# Altium footprint library Chronos.PcbLib: 65 footprints (part 2 of 5)
Each footprint in its own frame and in the unit in brackets; x right, y up, seen from the top. Pads: shape width x height; smd on the part's side, far side on the other; paste and mask are expansions set on the pad; w line width, h text height; cw(c..) or ccw(c..) is an arc to the next point about the centre after c.
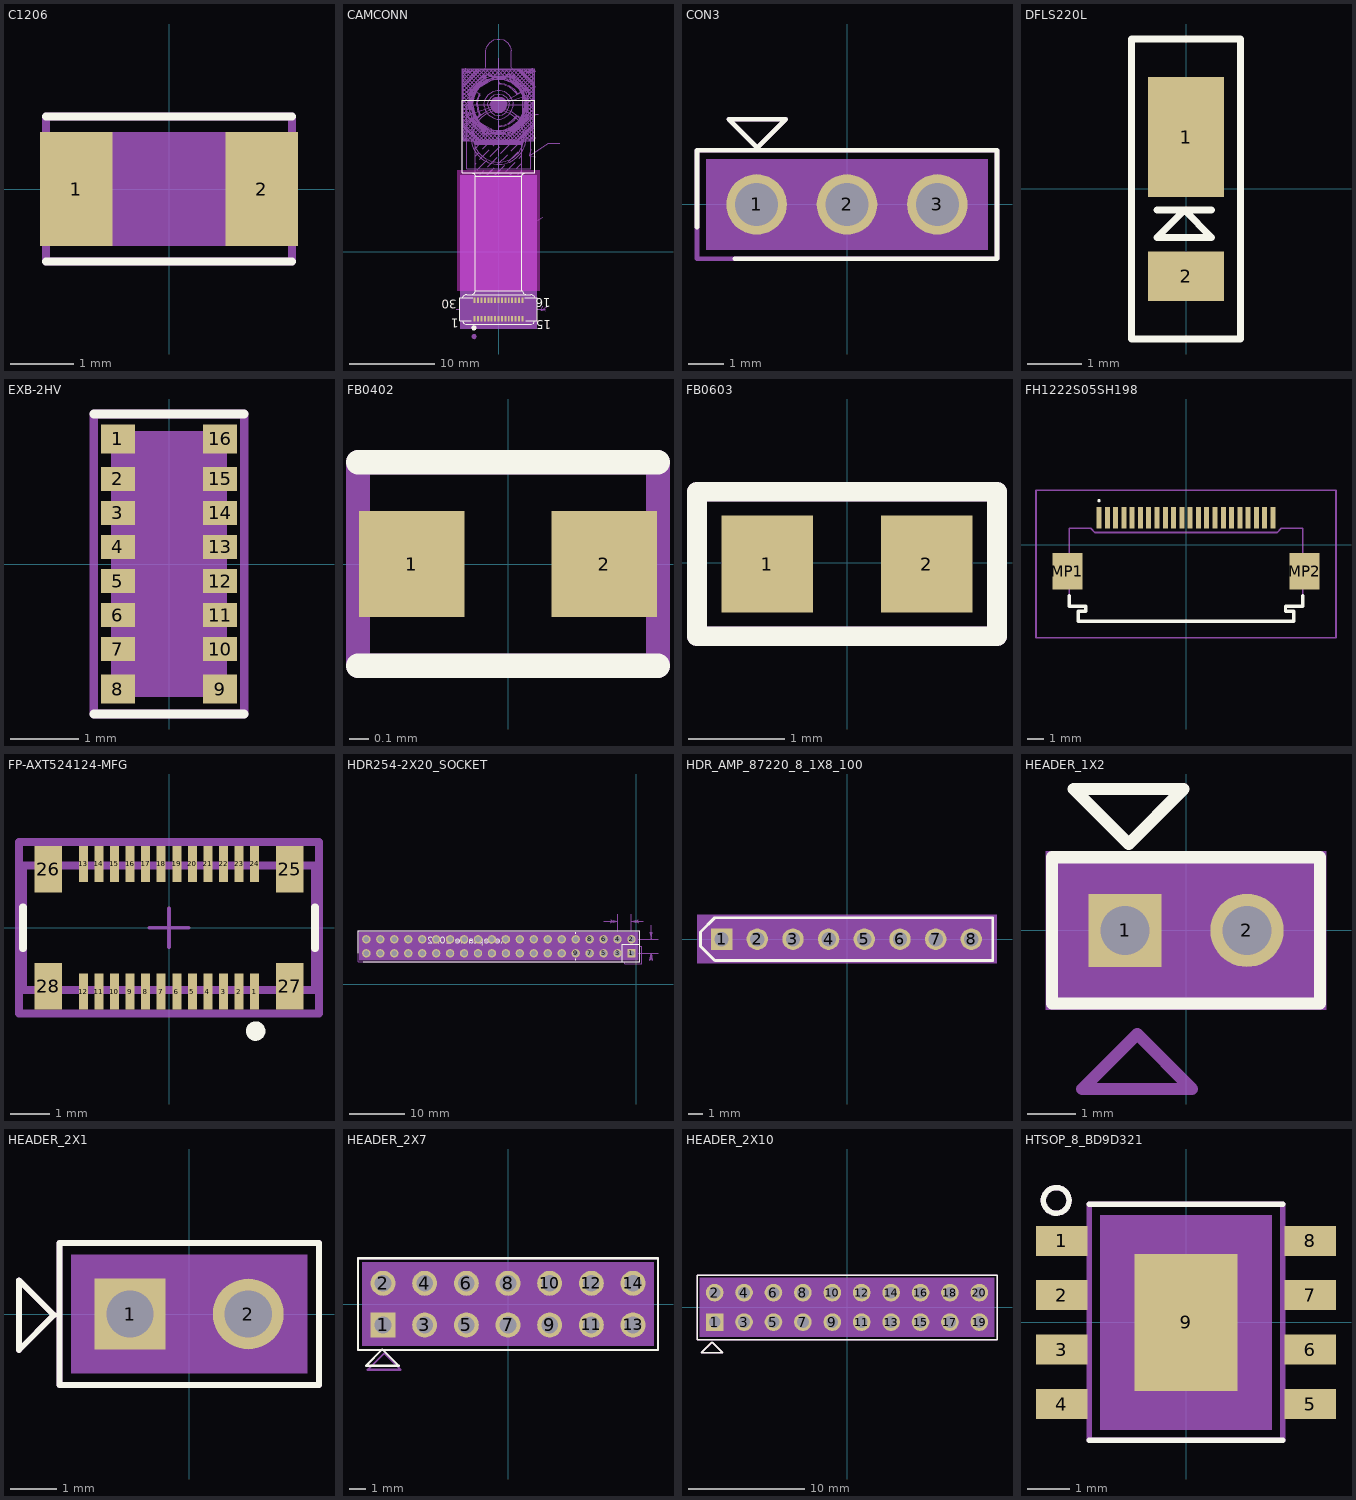
[diagram p1: the footprints below, top view; thin cyan lines are the x and y axes]

## C1206 [mm] "C1206"
pads (2):
  rect 1.16x1.82 smd: 1(-1.475,0) 2(1.475,0)
Top Overlay:
  lines w0.127: -1.954,-1.154 1.954,-1.154 ; -1.954,1.154 1.954,1.154
Top 3D Body:
  region: -1.7,-0.9 1.7,-0.9 1.7,0.9 -1.7,0.9
Top Assembly:
  lines w0.127: -1.954,-1.154 -1.954,1.154 1.954,1.154 1.954,-1.154 -1.954,-1.154
  text ".Designator" at 2.942,1.663 h1.02
Mechanical 29:
  text "2" at 1.475,0.203 h0.51
  text "1" at -1.475,0.203 h0.51
3D body: height 3.81, standoff 0, extent -1.7,-0.9 1.7,0.9

## CAMCONN [mm] "CAMCONN"
pads (30):
  rect 0.23x0.65 smd: 1(-2.8,-7.825) 2(-2.4,-7.825) 3(-2,-7.825) 4(-1.6,-7.825) 5(-1.2,-7.825) 6(-0.8,-7.825) 7(-0.4,-7.825) 8(0,-7.825) 9(0.4,-7.825) 10(0.8,-7.825) 11(1.2,-7.825) 12(1.6,-7.825) 13(2,-7.825) 14(2.4,-7.825) 15(2.8,-7.825) 16(2.8,-5.675) 17(2.4,-5.675) 18(2,-5.675) 19(1.6,-5.675) 20(1.2,-5.675) 21(0.8,-5.675) 22(0.4,-5.675) 23(0,-5.675) 24(-0.4,-5.675) 25(-0.8,-5.675) 26(-1.2,-5.675) 27(-1.6,-5.675) 28(-2,-5.675) 29(-2.4,-5.675) 30(-2.8,-5.675)
Top Layer keep-out:
  region: -4.826,9.582 -4.826,-4.566 4.826,-4.566 4.826,9.582
Top Overlay:
  dashed: -3.181,-8.914 -3.159,-9.025 -3.096,-9.119 -3.002,-9.181 -2.891,-9.204 -2.781,-9.181 -2.749,-9.16 -2.687,-9.119 -2.624,-9.025 -2.602,-8.914 -2.624,-8.803 -2.687,-8.709 -2.749,-8.668 -2.781,-8.646 -2.891,-8.624 -3.002,-8.646 -3.096,-8.709 -3.159,-8.803
  lines w0.127: -4.238,-8.085 -4.094,-8.347 -3.833,-8.491 -3.745,-8.491 ; -4.238,-5.394 -4.094,-5.132 -3.833,-4.988 -3.745,-4.988 ; -3.755,-8.491 3.755,-8.491 ; -3.755,-5.009 -3.147,-5.009 3.252,-5.009 3.755,-5.009 ; -3.175,-8.1 -4.55,-8.1 -4.55,-5.4 -3.048,-5.4 ; -3.147,9.283 -3,9.241 -2.874,9.157 -2.79,9.031 -2.749,8.884 ; -3.065,-4.988 -2.847,-4.868 -2.728,-4.651 -2.728,-4.579 ; 2.748,-4.505 2.748,1.378 2.748,8.884 ; 2.769,-4.589 -2.749,-4.589 -2.749,1.378 -2.749,8.884 ; 2.769,-4.582 2.914,-4.844 3.174,-4.988 ; 3.048,-5.4 4.55,-5.4 4.55,-8.1 3.175,-8.1 ; 3.147,9.283 3,9.241 2.874,9.157 2.79,9.031 2.748,8.884 ; 3.766,-8.491 3.852,-8.491 4.114,-8.347 4.259,-8.085 ; 3.766,-4.988 3.852,-4.988 4.114,-5.132 4.259,-5.394 ; -2.749,8.884 0,8.884 2.748,8.884 ; -4.259,9.283 4.259,9.283 4.259,17.779 -4.259,17.779 -4.259,9.283
  text "1" at -4.661,-7.833 h1.02
  text "15" at 6.176,-8.005 h1.02
  text "16" at 6.11,-5.445 h1.02
  text "30" at -4.886,-5.631 h1.02
Top 3D Body:
  region: 4.5,-6.75 4.5,9 -4.5,9 -4.5,-9 4.5,-9 4.5,-7.233
  region: -4.3,-7.85 -4.3,-5.65 4.3,-5.65 4.3,-7.85
Top Assembly:
  circle w0.127: c0,13.52 r3
  circle w0.127: c0,13.52 r3.25
  dashed: -3.159,-9.933 -3.137,-10.044 -3.075,-10.138 -2.981,-10.2 -2.87,-10.222 -2.759,-10.2 -2.727,-10.179 -2.665,-10.138 -2.602,-10.044 -2.58,-9.933 -2.602,-9.822 -2.665,-9.728 -2.727,-9.686 -2.759,-9.665 -2.87,-9.643 -2.981,-9.665 -3.075,-9.728 -3.137,-9.822
  lines w0.127: -4.259,-8.009 -4.259,-5.491 ; -4.238,-7.998 -4.238,-8.085 -4.094,-8.347 -3.833,-8.491 -3.745,-8.491 ; -4.238,-5.481 -4.238,-5.394 -4.094,-5.132 -3.833,-4.988 -3.745,-4.988 ; -3.755,-8.491 3.755,-8.491 ; -3.755,-5.009 -3.147,-5.009 3.252,-5.009 3.755,-5.009 ; -3.163,-5.65 -4.3,-5.65 -4.3,-7.85 -3.152,-7.85 ; -3.147,9.283 -3,9.241 -2.874,9.157 -2.79,9.031 -2.749,8.884 ; -3.065,-4.988 -2.847,-4.868 -2.728,-4.651 -2.728,-4.579 ; -2.749,-0.319 -2.749,8.884 ; -2.749,-0.24 -2.749,-4.589 2.769,-4.589 ; 1.268,14.698 1.101,13.949 ; 1.714,13.828 1.101,13.949 ; 2.748,-4.505 2.748,-0.319 2.748,8.884 ; 2.769,-4.582 2.914,-4.844 3.174,-4.988 ; 3.103,-5.65 4.3,-5.65 4.3,-7.85 3.126,-7.85 ; 3.111,3.291 2.903,2.776 ; 3.147,9.283 3,9.241 2.874,9.157 2.79,9.031 2.748,8.884 ; 3.432,2.655 2.903,2.776 ; 3.766,-8.491 3.852,-8.491 4.114,-8.347 4.259,-8.085 4.259,-7.998 ; 3.766,-4.988 3.852,-4.988 4.114,-5.132 4.259,-5.394 4.259,-5.481 ; 3.854,12.047 3.687,11.298 ; 4.259,-8.009 4.259,-5.491 ; 4.3,11.177 3.687,11.298 ; 4.668,16.167 4.416,16.167 4.416,16.166 1.101,13.949 ; 5.167,-6.362 5.027,-6.839 ; 5.211,4.04 2.903,2.776 ; 5.503,-6.933 5.027,-6.839 ; 5.78,-6.373 5.027,-6.839 ; 7.153,12.747 5.847,12.747 5.835,12.735 3.687,11.298 ; -2.749,8.884 0,8.884 2.748,8.884 ; -4.259,9.283 -4.259,17.779 4.259,17.779 4.259,9.283 -4.259,9.283 ; -3.75,9.77 -3.75,17.271 3.75,17.271 3.75,9.77 -3.75,9.77
  text "CONDUCTIVE ADHESIVE - CONTACT AREA" at 8.195,14.914 h0.18
  text "Cu EXPOSURE - GROUNDING" at 7.636,14.977 h0.18
  text "1" at -5.071,-7.988 h0.18
  text "30" at -5.421,-5.841 h0.18
  text "16" at 4.905,-5.752 h0.18
  text "15" at 4.957,-8.023 h0.18
  text ".Designator" at -2.492,-8.543 h0.18
  text "BENDING AREA" at 5.827,7.065 h0.18
  text "CAMERA" at 5.024,19.477 h0.18
  text "MATTING AREA" at 6.503,-7.982 h0.18
Mechanical 29:
  text "16" at 3.088,-5.675 h0.18
  text "17" at 2.688,-5.675 h0.18
  text "27" at -1.312,-5.675 h0.18
  text "28" at -1.712,-5.675 h0.18
  text "30" at -2.512,-5.675 h0.18
  text "13" at 2.288,-7.825 h0.18
  text "10" at 1.088,-7.825 h0.18
  text "7" at -0.256,-7.825 h0.18
  text "4" at -1.456,-7.825 h0.18
  text "21" at 1.088,-5.675 h0.18
  text "19" at 1.888,-5.675 h0.18
  text "1" at -2.656,-7.825 h0.18
  text "26" at -0.912,-5.675 h0.18
  text "22" at 0.688,-5.675 h0.18
  text "23" at 0.288,-5.675 h0.18
  text "18" at 2.288,-5.675 h0.18
  text "29" at -2.112,-5.675 h0.18
  text "15" at 3.088,-7.825 h0.18
  text "24" at -0.112,-5.675 h0.18
  text "25" at -0.512,-5.675 h0.18
  text "2" at -2.256,-7.825 h0.18
  text "12" at 1.888,-7.825 h0.18
  text "8" at 0.144,-7.825 h0.18
  text "14" at 2.688,-7.825 h0.18
  text "11" at 1.488,-7.825 h0.18
  text "5" at -1.056,-7.825 h0.18
  text "6" at -0.656,-7.825 h0.18
  text "9" at 0.544,-7.825 h0.18
  text "3" at -1.856,-7.825 h0.18
  text "20" at 1.488,-5.675 h0.18
Mechanical 31:
  drawing of 4435 lines, arcs and shapes, not listed
3D body: height 3.81, standoff 0, extent -4.5,-9 4.5,9
3D body: height 3.81, standoff 0, extent -4.3,-7.85 4.3,-5.65

## CON3 [mm] "CON3"
pads (3):
  round 1.7 hole 1.2: 1(-2.54,0) 2(0,0) 3(2.54,0)
Top Overlay:
  lines w0.127: -4.214,-0.636 -4.214,1.524 4.214,1.524 4.214,-1.524 -3.158,-1.524 ; -3.322,2.394 -2.522,1.594 -1.722,2.394 -3.322,2.394
  text ".Designator" at -0.455,1.917 h1.02
Top 3D Body:
  region: -3.96,1.27 -3.96,-1.27 3.96,-1.27 3.96,1.27
Top Assembly:
  lines w0.127: -4.214,-1.524 4.214,-1.524 4.214,1.524 -4.214,1.524 -4.214,-1.524 ; -3.322,2.394 -2.522,1.594 -1.722,2.394 -3.322,2.394
Mechanical 29:
  text "3" at 1.93,0 h1.52
  text "2" at -0.61,0 h1.52
  text "1" at -3.15,0 h1.52
3D body: height 3.81, standoff 0, extent -3.96,-1.27 3.96,1.27

## DFLS220L [mm] "DFLS220L"
pads (2):
  rect 1.4x2.2 smd: 1(0,0.95)
  rect 1.4x0.9 smd: 2(0,-1.6)
Top Overlay:
  lines w0.127: -0.53,-0.385 0.47,-0.385 ; -1.001,-2.751 1.001,-2.751 1.001,2.751 -1.001,2.751 -1.001,-2.751 ; -0.53,-0.886 0.47,-0.886 -0.03,-0.385 -0.53,-0.886
Mechanical 29:
  text "2" at 0,-2.108 h0.64
  text "1" at 0,0.442 h0.64
3D body "SOD-123_ONS.step": height 1.35, standoff 0, extent -0.915,-1.93 0.889,1.93

## EXB-2HV [mm] "EXB-2HV"
pads (16):
  rect 0.5x0.425 smd: 1(-0.75,1.837) 8(-0.75,-1.837) 9(0.75,-1.837) 16(0.75,1.837)
  rect 0.5x0.35 smd: 2(-0.75,1.25) 3(-0.75,0.75) 4(-0.75,0.25) 5(-0.75,-0.25) 6(-0.75,-0.75) 7(-0.75,-1.25) 10(0.75,-1.25) 11(0.75,-0.75) 12(0.75,-0.25) 13(0.75,0.25) 14(0.75,0.75) 15(0.75,1.25)
Top Overlay:
  lines w0.127: -1.104,-2.204 1.104,-2.204 ; -1.104,2.204 1.104,2.204
  text ".Designator" at 1.643,1.091 h1.02
Top 3D Body:
  region: -0.85,1.95 -0.85,-1.95 0.85,-1.95 0.85,1.95
Top Assembly:
  lines w0.127: -1.104,-2.204 -1.104,2.204 1.104,2.204 1.104,-2.204 -1.104,-2.204
Mechanical 29:
  text "8" at -1.36,-1.837 h1.52
  text "6" at -1.36,-0.75 h1.52
  text "4" at -1.36,0.25 h1.52
  text "5" at -1.36,-0.25 h1.52
  text "3" at -1.36,0.75 h1.52
  text "1" at -1.36,1.837 h1.52
  text "7" at -1.36,-1.25 h1.52
  text "2" at -1.36,1.25 h1.52
  text "16" at -0.469,1.837 h1.52
  text "9" at 0.14,-1.837 h1.52
  text "10" at -0.469,-1.25 h1.52
  text "11" at -0.469,-0.75 h1.52
  text "12" at -0.469,-0.25 h1.52
  text "13" at -0.469,0.25 h1.52
  text "14" at -0.469,0.75 h1.52
  text "15" at -0.469,1.25 h1.52
3D body: height 3.81, standoff 0, extent -0.85,-1.95 0.85,1.95

## FB0402 [mm] "FB0402"
pads (2):
  rect 0.55x0.55 smd: 1(-0.5,0) 2(0.5,0)
Top Overlay:
  lines w0.127: -0.779,-0.529 0.779,-0.529 ; -0.779,0.529 0.779,0.529
  text ".Designator" at -2.921,1.143 h1.02
Top Assembly:
  lines w0.127: -0.779,-0.529 0.779,-0.529 0.779,0.529 -0.779,0.529 -0.779,-0.529
Mechanical 29:
  text "1" at -0.5,0.203 h0.51
  text "2" at 0.5,0.203 h0.51
3D body "FER 0402.STEP": height 0.52, standoff 0, extent -0.5,-0.262 0.5,0.262

## FB0603 [mm] "FB0603"
pads (2):
  rect 0.95x1 smd: 1(-0.825,-0.013) 2(0.825,-0.013)
Top Overlay:
  lines w0.203: -1.554,-0.763 -1.554,0.738 1.554,0.738 1.554,-0.763 -1.554,-0.763
  text ".Designator" at -1.651,-1.905 h1.02
Top Assembly:
  lines w0.203: -1.554,-0.763 -1.554,0.738 1.554,0.738 1.554,-0.763 -1.554,-0.763
Mechanical 29:
  text "2" at 0.825,0.394 h1.02
  text "1" at -0.825,0.394 h1.02
3D body "FER 0603.STEP": height 0.82, standoff 0, extent -0.8,-0.412 0.8,0.412

## FH1222S05SH198 [mm]
pads (24):
  rect 0.3x1.3 smd: 1(-5.25,1.625) 2(-4.75,1.625) 3(-4.25,1.625) 4(-3.75,1.625) 5(-3.25,1.625) 6(-2.75,1.625) 7(-2.25,1.625) 8(-1.75,1.625) 9(-1.25,1.625) 10(-0.75,1.625) 11(-0.25,1.625) 12(0.25,1.625) 13(0.75,1.625) 14(1.25,1.625) 15(1.75,1.625) 16(2.25,1.625) 17(2.75,1.625) 18(3.25,1.625) 19(3.75,1.625) 20(4.25,1.625) 21(4.75,1.625) 22(5.25,1.625)
  rect 1.8x2.2 smd: MP1(-7.15,-1.625) MP2(7.15,-1.625)
Top Overlay:
  lines w0.1: -5.25,2.6 ccw(c-5.25,2.65) -5.25,2.7 ccw(c-5.25,2.65) -5.25,2.6
  lines w0.2: -7.05,-3.1 -7.05,-3.725 -6.05,-3.725 -6.05,-4.025 -6.5,-4.025 -6.5,-4.625 6.5,-4.625 6.5,-4.025 6,-4.025 6,-3.725 7.05,-3.725 7.05,-3.1
Mechanical 13:
  lines w0.1: -7.05,-3.725 -6.05,-3.725 -6.05,-4.025 -6.5,-4.025 -6.5,-4.625 0.25,-4.625 6.5,-4.625 6.5,-4.025 6,-4.025 6,-3.725 7.05,-3.725 7.05,0.975 5.75,0.975 5.5,0.725 -5.5,0.725 -5.75,0.975 -7.05,0.975 -7.05,-3.725
Mechanical 15:
  lines w0.1: -9.05,-5.625 -9.05,3.275 9.05,3.275 9.05,-5.625 -9.05,-5.625
3D body "FH12-22S-0.5SH-1--98.STEP": height 2.15, standoff 0.05, extent -7.55,-4.572 7.55,1.828

## FP-AXT524124-MFG [mm]
pads (28):
  rect 0.23x0.92 smd paste-1000 mask+0: 1(2.2,-1.64) 2(1.8,-1.64) 3(1.4,-1.64) 4(1,-1.64) 5(0.6,-1.64) 6(0.2,-1.64) 7(-0.2,-1.64) 8(-0.6,-1.64) 9(-1,-1.64) 10(-1.4,-1.64) 11(-1.8,-1.64) 12(-2.2,-1.64) 13(-2.2,1.64) 14(-1.8,1.64) 15(-1.4,1.64) 16(-1,1.64) 17(-0.6,1.64) 18(-0.2,1.64) 19(0.2,1.64) 20(0.6,1.64) 21(1,1.64) 22(1.4,1.64) 23(1.8,1.64) 24(2.2,1.64)
  rect 0.7x1.2 smd paste+0 mask+0: 25(3.1,1.5) 26(-3.1,1.5) 27(3.1,-1.5) 28(-3.1,-1.5)
Top Overlay:
  circle w0.25: c2.223,-2.653 r0.125
  lines w0.2: -3.75,-0.525 -3.75,0.525 ; 3.75,-0.525 3.75,0.525
Top Paste:
  region: -2.1,2 -2.3,2 -2.3,1.49 -2.1,1.49
  region: -1.7,2 -1.9,2 -1.9,1.49 -1.7,1.49
  region: -1.3,2 -1.5,2 -1.5,1.49 -1.3,1.49
  region: -0.9,2 -1.1,2 -1.1,1.49 -0.9,1.49
  region: -0.5,2 -0.7,2 -0.7,1.49 -0.5,1.49
  region: -0.1,2 -0.3,2 -0.3,1.49 -0.1,1.49
  region: 0.3,2 0.1,2 0.1,1.49 0.3,1.49
  region: 0.7,2 0.5,2 0.5,1.49 0.7,1.49
  region: 1.1,2 0.9,2 0.9,1.49 1.1,1.49
  region: 1.5,2 1.3,2 1.3,1.49 1.5,1.49
  region: 1.9,2 1.7,2 1.7,1.49 1.9,1.49
  region: 2.3,2 2.1,2 2.1,1.49 2.3,1.49
  region: -2.1,-1.49 -2.3,-1.49 -2.3,-2 -2.1,-2
  region: -1.7,-1.49 -1.9,-1.49 -1.9,-2 -1.7,-2
  region: -1.3,-1.49 -1.5,-1.49 -1.5,-2 -1.3,-2
  region: -0.9,-1.49 -1.1,-1.49 -1.1,-2 -0.9,-2
  region: -0.5,-1.49 -0.7,-1.49 -0.7,-2 -0.5,-2
  region: -0.1,-1.49 -0.3,-1.49 -0.3,-2 -0.1,-2
  region: 0.3,-1.49 0.1,-1.49 0.1,-2 0.3,-2
  region: 0.7,-1.49 0.5,-1.49 0.5,-2 0.7,-2
  region: 1.1,-1.49 0.9,-1.49 0.9,-2 1.1,-2
  region: 1.5,-1.49 1.3,-1.49 1.3,-2 1.5,-2
  region: 1.9,-1.49 1.7,-1.49 1.7,-2 1.9,-2
  region: 2.3,-1.49 2.1,-1.49 2.1,-2 2.3,-2
Top Courtyard:
  lines w0.2: -3.85,-2.2 -3.85,2.2 3.85,2.2 3.85,-2.2 -3.85,-2.2
Top 3D Body:
  lines w0.2: -3.75,-1.6 3.75,-1.6 3.75,1.6 -3.75,1.6 -3.75,-1.6
Top Component Center:
  lines w0.1: -0.5,0 0.5,0 ; 0,-0.5 0,0.5
Top Assembly:
  lines w0.2: -3.85,-2.2 -3.85,2.2 3.85,2.2 3.85,-2.2 -3.85,-2.2
  text ".Designator" at 0,0.219 h1.5
3D body "Conn_Panasonic_AXT524124_eec.STEP": height 0.25, standoff 0, extent -3.85,-2.2 3.85,2.2

## HDR254-2X20_SOCKET [mil] "HDR254-2X20_SOCKET"
pads (40):
  rect 60x60 / inner round 60 / far side rect 60x60 hole 40: 1(-35,223.33)
  round 60 hole 40: 2(-35,323.33) 3(-135,223.33) 4(-135,323.33) 5(-235,223.33) 6(-235,323.33) 7(-335,223.33) 8(-335,323.33) 9(-435,223.33) 10(-435,323.33) 11(-535,223.33) 12(-535,323.33) 13(-635,223.33) 14(-635,323.33) 15(-735,223.33) 16(-735,323.33) 17(-835,223.33) 18(-835,323.33) 19(-935,223.33) 20(-935,323.33) 21(-1035,223.33) 22(-1035,323.33) 23(-1135,223.33) 24(-1135,323.33) 25(-1235,223.33) 26(-1235,323.33) 27(-1335,223.33) 28(-1335,323.33) 29(-1435,223.33) 30(-1435,323.33) 31(-1535,223.33) 32(-1535,323.33) 33(-1635,223.33) 34(-1635,323.33) 35(-1735,223.33) 36(-1735,323.33) 37(-1835,223.33) 38(-1835,323.33) 39(-1935,223.33) 40(-1935,323.33)
Top Overlay:
  lines w1: -435,173.33 -435,183.33 ; -435,363.33 -435,373.33
  lines w5: -1995,223.88 -1995,383.33 25,383.33 25,163.33 -1956.43,163.33 ; -100.1,162.87 24.9,162.87 24.9,287.87 9.9,287.87 -100.1,287.87 -100.1,162.87
  text "Receptacle 20X2" at -925,293.33 h50
Top 3D Body:
  region: 15,373.33 -985,373.33 -1985,373.33 -1985,173.33 -985,173.33 15,173.33
Bottom Component Center:
  text "BODY:50.8X5.08MM" at 5,143.33 h50
  text "PITCH:2.54MM" at 5,73.33 h50
  text "HR254-2X20_SOCKET" at 0,0 h50
Top Assembly:
  lines w5: -85,163.33 -85,148.33 40,148.33 40,273.33 25,273.33 ; -1995,163.33 -1995,383.33 25,383.33 25,163.33 -1995,163.33
Mechanical 29:
  text "6" at -235,313.33 h25
  text "9" at -435,213.33 h25
  text "14" at -635,303.33 h25
  text "20" at -935,303.33 h25
  text "25" at -1235,203.33 h25
  text "30" at -1435,303.33 h25
  text "34" at -1635,303.33 h25
  text "39" at -1935,203.33 h25
  text "10" at -435,303.33 h25
  text "11" at -535,203.33 h25
  text "12" at -535,303.33 h25
  text "4" at -135,313.33 h25
  text "2" at -35,313.33 h25
  text "8" at -335,313.33 h25
  text "13" at -635,203.33 h25
  text "15" at -735,203.33 h25
  text "37" at -1835,203.33 h25
  text "16" at -735,303.33 h25
  text "22" at -1035,303.33 h25
  text "18" at -835,303.33 h25
  text "19" at -935,203.33 h25
  text "21" at -1035,203.33 h25
  text "26" at -1235,303.33 h25
  text "24" at -1135,303.33 h25
  text "23" at -1135,203.33 h25
  text "7" at -335,213.33 h25
  text "29" at -1435,203.33 h25
  text "31" at -1535,203.33 h25
  text "33" at -1635,203.33 h25
  text "5" at -235,213.33 h25
  text "32" at -1535,303.33 h25
  text "35" at -1735,203.33 h25
  text "36" at -1735,303.33 h25
  text "38" at -1835,303.33 h25
  text "40" at -1935,303.33 h25
  text "3" at -135,213.33 h25
  text "27" at -1335,203.33 h25
  text "28" at -1335,303.33 h25
  text "1" at -35,213.33 h25
  text "17" at -835,203.33 h25
Bottom Assembly:
  text "40" at -2002.52,341.37 h31
  text "39" at -1997.05,235.97 h31
  text "2" at 54.79,345.03 h31
  text "1" at 60.7,244.33 h31
  text ".Designator" at -925,293.33 h50
Mechanical37:
  lines w1: -235,453.33 -135,453.33 ; -135,323.33 -135,503.33 ; -35,223.33 155,223.33 ; -35,503.33 -35,323.33 155,323.33 ; 48.25,453.33 -35,453.33 ; 105,180.08 105,223.33 ; 105,423.33 105,323.33 ; -185,443.33 -180,448.33 -135,453.33 ; -185,443.33 -175,453.33 ; -185,443.33 -135,453.33 ; -175,453.33 -135,453.33 ; -175,453.33 -180,458.33 -135,453.33 ; -175,453.33 -185,463.33 -135,453.33 ; -35,453.33 10,458.33 15,463.33 ; -35,453.33 5,453.33 ; -35,453.33 10,448.33 5,453.33 ; -35,453.33 15,443.33 5,453.33 ; -35,453.33 15,463.33 ; 5,453.33 15,463.33 ; 95,373.33 100,368.33 105,323.33 ; 95,373.33 105,363.33 ; 95,373.33 105,323.33 ; 105,183.33 105,223.33 ; 105,183.33 100,178.33 105,223.33 ; 105,183.33 115,173.33 ; 105,183.33 95,173.33 105,223.33 ; 105,223.33 110,178.33 115,173.33 ; 105,223.33 115,173.33 ; 105,323.33 105,363.33 ; 105,323.33 110,368.33 105,363.33 ; 105,323.33 115,373.33 105,363.33
  text "2.54" at 178.5,468.83 h31
  text "2.54" at 89.5,156.83 h31
3D body: height 150, standoff 0, extent -1985,-373.33 15,-173.33

## HDR_AMP_87220_8_1X8_100 [mil] "HDR_AMP_87220_8_1X8_100"
pads (8):
  rect 60x60 hole 40: 1(-351.5,-0.5)
  round 60 hole 40: 2(-251.5,-0.5) 3(-151.5,-0.5) 4(-51.5,-0.5) 5(48.5,-0.5) 6(148.5,-0.5) 7(248.5,-0.5) 8(348.5,-0.5)
Top Overlay:
  lines w8: -410.52,-20.5 -410.52,19.5 -370.52,59.5 408.5,59.5 408.5,-60.5 -370.52,-60.5 -410.52,-20.5
Top 3D Body:
  region: -420.5,-67.5 420.5,-67.5 420.5,67.5 -420.5,67.5
Top Assembly:
  lines w8: -410.7,-20.5 -410.7,19.5 -370.7,59.5 408.5,59.5 408.5,-60.5 -370.7,-60.5 -410.7,-20.5
  text ".Designator" at -311.32,-14.22 h25
Mechanical 29:
  text "1" at -351.5,-20.5 h25
  text "3" at -151.5,-20.5 h25
  text "2" at -251.5,-20.5 h25
  text "8" at 348.5,-20.5 h25
  text "6" at 148.5,-20.5 h25
  text "7" at 248.5,-20.5 h25
  text "5" at 48.5,-20.5 h25
  text "4" at -51.5,-20.5 h25
3D body: height 150, standoff 0, extent -420.5,-67.5 420.5,67.5

## HEADER_1X2 [mil] "HEADER_1X2"
pads (2):
  rect 60x60 / inner round 60 / far side rect 60x60 hole 40: 1(-50,0)
  round 60 hole 40: 2(50,0)
Top Overlay:
  lines w10: -57,116 -2,116 -47,71 -92,116 -17,116 ; -110,-60 110,-60 110,60 -110,60 -110,-60
Top 3D Body:
  region: -115,-65 115,-65 115,65 -115,65
Top Assembly:
  lines w10: -70,-130 5,-130 -40,-85 -85,-130 -30,-130 ; -110,-60 110,-60 110,60 -109.02,60 -110,59.02 -110,-60
  text ".Designator" at -9.82,-13.72 h25
Mechanical 29:
  text "2" at 70,0 h25
  text "1" at -30,0 h25
3D body: height 150, standoff 0, extent -115,-65 115,65

## HEADER_2X1 [mil] "HEADER_2X1"
pads (2):
  rect 60x60 / inner round 60 / far side rect 60x60 hole 40: 1(-50,0)
  round 60 hole 40: 2(50,0)
Top Overlay:
  lines w5: -144.15,-30.45 -144.15,28.61 -114.63,-0.92 -144.15,-30.45 ; -110,-60 -110,60 110,60 110,-60 -110,-60
  text ".Designator" at 66.6,77.01 h40
Top 3D Body:
  region: -100,50 -100,-50 100,-50 100,50
Top Assembly:
  lines w5: -144.15,-30.45 -144.15,28.61 -114.63,-0.92 -144.15,-30.45 ; -110,-60 -110,60 110,60 110,-60 -110,-60
Mechanical 29:
  text "1" at -60.44,0.43 h20
  text "2" at 39.56,0.43 h20
3D body: height 150, standoff 0, extent -100,-50 100,50

## HEADER_2X7 [mil] "HEADER_2X7"
pads (14):
  rect 60x60 hole 40: 1(-300,-50)
  round 60 hole 40: 2(-300,50) 3(-200,-50) 4(-200,50) 5(-100,-50) 6(-100,50) 7(0,-50) 8(0,50) 9(100,-50) 10(100,50) 11(200,-50) 12(200,50) 13(300,-50) 14(300,50)
Top Overlay:
  lines w5: -360,-110 360,-110 360,110 -360,110 -360,-110 ; -340.82,-147.92 -262.08,-147.92 -301.45,-108.55 -340.82,-147.92
Top 3D Body:
  region: -350,100 -350,-100 350,-100 350,100
Top Assembly:
  lines w5: -360,-110 360,-110 360,110 -360,110 -360,-110 ; -336.51,-157.5 -257.77,-157.5 -297.14,-118.13 -336.51,-157.5
  text ".Designator" at 369.98,-1.02 h40
Mechanical 29:
  text "4" at -200,42 h20
  text "13" at 300,-66 h20
  text "7" at 0,-58 h20
  text "9" at 100,-58 h20
  text "8" at 0,42 h20
  text "3" at -200,-58 h20
  text "14" at 300,34 h20
  text "10" at 100,34 h20
  text "1" at -300,-58 h20
  text "2" at -300,34 h20
  text "11" at 200,-66 h20
  text "12" at 200,34 h20
  text "5" at -100,-58 h20
  text "6" at -100,42 h20
Mechanical 32:
  text "LEAD LENGTH IS 100 mil" at -554.5,-25 h50
3D body: height 150, standoff 0, extent -350,-100 350,100

## HEADER_2X10 [mil] "HEADER_2X10"
pads (20):
  rect 60x60 hole 40: 1(-450,-50)
  round 60 hole 40: 2(-450,50) 3(-350,-50) 4(-350,50) 5(-250,-50) 6(-250,50) 7(-150,-50) 8(-150,50) 9(-50,-50) 10(-50,50) 11(50,-50) 12(50,50) 13(150,-50) 14(150,50) 15(250,-50) 16(250,50) 17(350,-50) 18(350,50) 19(450,-50) 20(450,50)
Top Overlay:
  lines w5: -459.2,-119 -494.9,-154.7 -422.3,-154.7 -458,-119 ; -510,-110 -510,110 510,110 510,-110 -510,-110
Top 3D Body:
  region: -500,100 -500,-100 500,-100 500,100
Top Assembly:
  lines w5: -459,-119.2 -494.7,-154.9 -422.1,-154.9 -457.8,-119.2 ; -510,-110 -510,110 510,110 510,-110 -510,-110
  text ".Designator" at 13.3,297.4 h20
Mechanical 29:
  text "12" at 50,34 h20
  text "3" at -350,-58 h20
  text "20" at 450,34 h20
  text "19" at 450,-66 h20
  text "16" at 250,34 h20
  text "15" at 250,-66 h20
  text "11" at 50,-66 h20
  text "8" at -150,42 h20
  text "7" at -150,-58 h20
  text "4" at -350,42 h20
  text "17" at 350,-66 h20
  text "18" at 350,34 h20
  text "13" at 150,-66 h20
  text "14" at 150,34 h20
  text "9" at -50,-58 h20
  text "10" at -50,34 h20
  text "5" at -250,-58 h20
  text "6" at -250,42 h20
  text "1" at -450,-58 h20
  text "2" at -450,34 h20
3D body: height 150, standoff 0, extent -500,-100 500,100

## HTSOP_8_BD9D321 [mm] "HTSOP_8_BD9D321"
pads (9):
  rect 1.2x0.7 smd: 1(-2.9,1.905) 2(-2.9,0.635) 3(-2.9,-0.635) 4(-2.9,-1.905) 5(2.9,-1.905) 6(2.9,-0.635) 7(2.9,0.635) 8(2.9,1.905)
  rect 2.4x3.2 smd: 9(0,0)
Top Overlay:
  circle w0.127: c-3.027,2.846 r0.3
  lines w0.127: -2.254,-2.754 2.254,-2.754 ; -2.254,2.754 2.254,2.754
  text ".Designator" at 3.186,-5.264 h1.02
Top 3D Body:
  region: -2,2.5 -2,-2.5 2,-2.5 2,2.5
Top Assembly:
  circle w0.127: c-3.027,2.846 r0.3
  lines w0.127: -2.254,-2.754 -2.254,2.754 2.254,2.754 2.254,-2.754 -2.254,-2.754
Mechanical 29:
  text "4" at -2.9,-2.108 h0.51
  text "7" at 2.9,0.432 h0.51
  text "2" at -2.9,0.432 h0.51
  text "6" at 2.9,-0.838 h0.51
  text "3" at -2.9,-0.838 h0.51
  text "1" at -2.9,1.702 h0.51
  text "8" at 2.9,1.702 h0.51
  text "9" at 0,-0.203 h0.51
  text "5" at 2.9,-2.108 h0.51
3D body: height 3.81, standoff 0, extent -2,-2.5 2,2.5